# Altium schematic symbol library jlcpcb_2025_04_capacitors_extended_0805.schlib: 3281 symbols (part 10 of 18) (continued)
## CC0805MKX5R5BB106
designator C?  Capacitance: 10uF  (hidden comment: *)
Capacitor, Ceramic (MLCC), 10uF, ±20%, 6.3V, X5R, ±20%, SMD 0805; Manufacturer: YAGEO; Manufacturer Part Number: CC0805MKX5R5BB106; Package Size: 0805; JLCPCB Basic Part: No; JLCPCB Part Number: C527238; Supplier 1: LCSC; Category: Capacitors - MLCC; Supplier Part Number 1: C527238; Tolerance: ±20%; Voltage Rating: 6.3V; Temperature Coefficient: X5R; RoHS: Yes; ComponentLink1Description: Datasheet; ComponentLink1URL: https://wmsc.lcsc.com/wmsc/upload/file/pdf/v2/lcsc/2407081117_YAGEO-CC0805MKX5R5BB106_C527238.pdf; ComponentLink2Description: JLCPCB Part URL; ComponentLink2URL: https://jlcpcb.com/partdetail/C527238; ComponentLink3Description: LCSC Part URL; ComponentLink3URL: https://lcsc.com/product-detail/Multilayer-Ceramic-Capacitors-MLCC---SMD-SMT_YAGEO-YAGEO-CC0805MKX5R5BB106_C527238.html
footprint CAP-0805 (0805 (2012M) Capacitor)
pins: 1, 2

## CC0805MKX5R5BB226
designator C?  Capacitance: 22uF  (hidden comment: *)
Capacitor, Ceramic (MLCC), 22uF, ±20%, 6.3V, X5R, ±20%, SMD 0805; Manufacturer: YAGEO; Manufacturer Part Number: CC0805MKX5R5BB226; Package Size: 0805; JLCPCB Basic Part: No; JLCPCB Part Number: C109462; Supplier 1: LCSC; Category: Capacitors - MLCC; Supplier Part Number 1: C109462; Tolerance: ±20%; Voltage Rating: 6.3V; Temperature Coefficient: X5R; RoHS: Yes; ComponentLink1Description: Datasheet; ComponentLink1URL: https://wmsc.lcsc.com/wmsc/upload/file/pdf/v2/lcsc/2407081117_YAGEO-CC0805MKX5R5BB226_C109462.pdf; ComponentLink2Description: JLCPCB Part URL; ComponentLink2URL: https://jlcpcb.com/partdetail/C109462; ComponentLink3Description: LCSC Part URL; ComponentLink3URL: https://lcsc.com/product-detail/Multilayer-Ceramic-Capacitors-MLCC---SMD-SMT_YAGEO-YAGEO-CC0805MKX5R5BB226_C109462.html
footprint CAP-0805 (0805 (2012M) Capacitor)
pins: 1, 2

## CC0805MKX5R5BB475
designator C?  Capacitance: 4.7uF  (hidden comment: *)
Capacitor, Ceramic (MLCC), 4.7uF, ±20%, 6.3V, X5R, ±20%, SMD 0805; Manufacturer: YAGEO; Manufacturer Part Number: CC0805MKX5R5BB475; Package Size: 0805; JLCPCB Basic Part: No; JLCPCB Part Number: C577033; Supplier 1: LCSC; Category: Capacitors - MLCC; Supplier Part Number 1: C577033; Tolerance: ±20%; Voltage Rating: 6.3V; Temperature Coefficient: X5R; RoHS: Yes; ComponentLink1Description: Datasheet; ComponentLink1URL: https://wmsc.lcsc.com/wmsc/upload/file/pdf/v2/lcsc/2407081117_YAGEO-CC0805MKX5R5BB475_C577033.pdf; ComponentLink2Description: JLCPCB Part URL; ComponentLink2URL: https://jlcpcb.com/partdetail/C577033; ComponentLink3Description: LCSC Part URL; ComponentLink3URL: https://lcsc.com/product-detail/Multilayer-Ceramic-Capacitors-MLCC---SMD-SMT_YAGEO-YAGEO-CC0805MKX5R5BB475_C577033.html
footprint CAP-0805 (0805 (2012M) Capacitor)
pins: 1, 2

## CC0805MKX5R5BB476
designator C?  Capacitance: 47uF  (hidden comment: *)
Capacitor, Ceramic (MLCC), 47uF, ±20%, 6.3V, X5R, ±20%, SMD 0805; Manufacturer: YAGEO; Manufacturer Part Number: CC0805MKX5R5BB476; Package Size: 0805; JLCPCB Basic Part: No; JLCPCB Part Number: C109461; Supplier 1: LCSC; Category: Capacitors - MLCC; Supplier Part Number 1: C109461; Tolerance: ±20%; Voltage Rating: 6.3V; Temperature Coefficient: X5R; RoHS: Yes; ComponentLink1Description: Datasheet; ComponentLink1URL: https://wmsc.lcsc.com/wmsc/upload/file/pdf/v2/lcsc/2407081117_YAGEO-CC0805MKX5R5BB476_C109461.pdf; ComponentLink2Description: JLCPCB Part URL; ComponentLink2URL: https://jlcpcb.com/partdetail/C109461; ComponentLink3Description: LCSC Part URL; ComponentLink3URL: https://lcsc.com/product-detail/Multilayer-Ceramic-Capacitors-MLCC---SMD-SMT_YAGEO-YAGEO-CC0805MKX5R5BB476_C109461.html
footprint CAP-0805 (0805 (2012M) Capacitor)
pins: 1, 2

## CC0805MKX5R6BB225
designator C?  Capacitance: 2200000pF  (hidden comment: *)
Capacitor, Ceramic (MLCC), 2200000pF, ±20%, 10V, X5R, ±20%, SMD 0805; Manufacturer: YAGEO; Manufacturer Part Number: CC0805MKX5R6BB225; Package Size: 0805; JLCPCB Basic Part: No; JLCPCB Part Number: C577035; Supplier 1: LCSC; Category: Capacitors - MLCC; Supplier Part Number 1: C577035; Tolerance: ±20%; Voltage Rating: 10V; Temperature Coefficient: X5R; RoHS: Yes; ComponentLink1Description: Datasheet; ComponentLink1URL: https://wmsc.lcsc.com/wmsc/upload/file/pdf/v2/lcsc/2407081117_YAGEO-CC0805MKX5R6BB225_C577035.pdf; ComponentLink2Description: JLCPCB Part URL; ComponentLink2URL: https://jlcpcb.com/partdetail/C577035; ComponentLink3Description: LCSC Part URL; ComponentLink3URL: https://lcsc.com/product-detail/Multilayer-Ceramic-Capacitors-MLCC---SMD-SMT_YAGEO-YAGEO-CC0805MKX5R6BB225_C577035.html
footprint CAP-0805 (0805 (2012M) Capacitor)
pins: 1, 2

## CC0805MKX5R6BB226
designator C?  Capacitance: 22uF  (hidden comment: *)
Capacitor, Ceramic (MLCC), 22uF, ±20%, 10V, X5R, ±20%, SMD 0805; Manufacturer: YAGEO; Manufacturer Part Number: CC0805MKX5R6BB226; Package Size: 0805; JLCPCB Basic Part: No; JLCPCB Part Number: C109314; Supplier 1: LCSC; Category: Capacitors - MLCC; Supplier Part Number 1: C109314; Tolerance: ±20%; Voltage Rating: 10V; Temperature Coefficient: X5R; RoHS: Yes; ComponentLink1Description: Datasheet; ComponentLink1URL: https://wmsc.lcsc.com/wmsc/upload/file/pdf/v2/lcsc/2407081117_YAGEO-CC0805MKX5R6BB226_C109314.pdf; ComponentLink2Description: JLCPCB Part URL; ComponentLink2URL: https://jlcpcb.com/partdetail/C109314; ComponentLink3Description: LCSC Part URL; ComponentLink3URL: https://lcsc.com/product-detail/Multilayer-Ceramic-Capacitors-MLCC---SMD-SMT_YAGEO-YAGEO-CC0805MKX5R6BB226_C109314.html
footprint CAP-0805 (0805 (2012M) Capacitor)
pins: 1, 2

## CC0805MKX5R6BB476
designator C?  Capacitance: 47uF  (hidden comment: *)
Capacitor, Ceramic (MLCC), 47uF, ±20%, 10V, X5R, ±20%, SMD 0805; Manufacturer: YAGEO; Manufacturer Part Number: CC0805MKX5R6BB476; Package Size: 0805; JLCPCB Basic Part: No; JLCPCB Part Number: C2179580; Supplier 1: LCSC; Category: Capacitors - MLCC; Supplier Part Number 1: C2179580; Tolerance: ±20%; Voltage Rating: 10V; Temperature Coefficient: X5R; RoHS: Yes; ComponentLink1Description: Datasheet; ComponentLink1URL: https://wmsc.lcsc.com/wmsc/upload/file/pdf/v2/lcsc/2407081117_YAGEO-CC0805MKX5R6BB476_C2179580.pdf; ComponentLink2Description: JLCPCB Part URL; ComponentLink2URL: https://jlcpcb.com/partdetail/C2179580; ComponentLink3Description: LCSC Part URL; ComponentLink3URL: https://lcsc.com/product-detail/Multilayer-Ceramic-Capacitors-MLCC---SMD-SMT_YAGEO-YAGEO-CC0805MKX5R6BB476_C2179580.html
footprint CAP-0805 (0805 (2012M) Capacitor)
pins: 1, 2

## CC0805MKX5R7BB226
designator C?  Capacitance: 22uF  (hidden comment: *)
Capacitor, Ceramic (MLCC), 22uF, ±20%, 16V, X5R, ±20%, SMD 0805; Manufacturer: YAGEO; Manufacturer Part Number: CC0805MKX5R7BB226; Package Size: 0805; JLCPCB Basic Part: No; JLCPCB Part Number: C128856; Supplier 1: LCSC; Category: Capacitors - MLCC; Supplier Part Number 1: C128856; Tolerance: ±20%; Voltage Rating: 16V; Temperature Coefficient: X5R; RoHS: Yes; ComponentLink1Description: Datasheet; ComponentLink1URL: https://wmsc.lcsc.com/wmsc/upload/file/pdf/v2/lcsc/2407081117_YAGEO-CC0805MKX5R7BB226_C128856.pdf; ComponentLink2Description: JLCPCB Part URL; ComponentLink2URL: https://jlcpcb.com/partdetail/C128856; ComponentLink3Description: LCSC Part URL; ComponentLink3URL: https://lcsc.com/product-detail/Multilayer-Ceramic-Capacitors-MLCC---SMD-SMT_YAGEO-YAGEO-CC0805MKX5R7BB226_C128856.html
footprint CAP-0805 (0805 (2012M) Capacitor)
pins: 1, 2

## CC0805MKX5R8BB105
designator C?  Capacitance: 1uF  (hidden comment: *)
Capacitor, Ceramic (MLCC), 1uF, ±20%, 25V, X5R, ±20%, SMD 0805; Manufacturer: YAGEO; Manufacturer Part Number: CC0805MKX5R8BB105; Package Size: 0805; JLCPCB Basic Part: No; JLCPCB Part Number: C577038; Supplier 1: LCSC; Category: Capacitors - MLCC; Supplier Part Number 1: C577038; Tolerance: ±20%; Voltage Rating: 25V; Temperature Coefficient: X5R; RoHS: Yes; ComponentLink1Description: Datasheet; ComponentLink1URL: https://wmsc.lcsc.com/wmsc/upload/file/pdf/v2/lcsc/2407081117_YAGEO-CC0805MKX5R8BB105_C577038.pdf; ComponentLink2Description: JLCPCB Part URL; ComponentLink2URL: https://jlcpcb.com/partdetail/C577038; ComponentLink3Description: LCSC Part URL; ComponentLink3URL: https://lcsc.com/product-detail/Multilayer-Ceramic-Capacitors-MLCC---SMD-SMT_YAGEO-YAGEO-CC0805MKX5R8BB105_C577038.html
footprint CAP-0805 (0805 (2012M) Capacitor)
pins: 1, 2

## CC0805MKX5R8BB226
designator C?  Capacitance: 22uF  (hidden comment: *)
Capacitor, Ceramic (MLCC), 22uF, ±20%, 25V, X5R, ±20%, SMD 0805; Manufacturer: YAGEO; Manufacturer Part Number: CC0805MKX5R8BB226; Package Size: 0805; JLCPCB Basic Part: No; JLCPCB Part Number: C784585; Supplier 1: LCSC; Category: Capacitors - MLCC; Supplier Part Number 1: C784585; Tolerance: ±20%; Voltage Rating: 25V; Temperature Coefficient: X5R; RoHS: Yes; ComponentLink1Description: Datasheet; ComponentLink1URL: https://wmsc.lcsc.com/wmsc/upload/file/pdf/v2/lcsc/2407081117_YAGEO-CC0805MKX5R8BB226_C784585.pdf; ComponentLink2Description: JLCPCB Part URL; ComponentLink2URL: https://jlcpcb.com/partdetail/C784585; ComponentLink3Description: LCSC Part URL; ComponentLink3URL: https://lcsc.com/product-detail/Multilayer-Ceramic-Capacitors-MLCC---SMD-SMT_YAGEO-YAGEO-CC0805MKX5R8BB226_C784585.html
footprint CAP-0805 (0805 (2012M) Capacitor)
pins: 1, 2

## CC0805MKX7R6BB105
designator C?  Capacitance: 1uF  (hidden comment: *)
Capacitor, Ceramic (MLCC), 1uF, ±20%, 10V, X7R, ±20%, SMD 0805; Manufacturer: YAGEO; Manufacturer Part Number: CC0805MKX7R6BB105; Package Size: 0805; JLCPCB Basic Part: No; JLCPCB Part Number: C527239; Supplier 1: LCSC; Category: Capacitors - MLCC; Supplier Part Number 1: C527239; Tolerance: ±20%; Voltage Rating: 10V; Temperature Coefficient: X7R; RoHS: Yes; ComponentLink1Description: Datasheet; ComponentLink1URL: https://wmsc.lcsc.com/wmsc/upload/file/pdf/v2/lcsc/2006101835_YAGEO-CC0805MKX7R6BB105_C527239.pdf; ComponentLink2Description: JLCPCB Part URL; ComponentLink2URL: https://jlcpcb.com/partdetail/C527239; ComponentLink3Description: LCSC Part URL; ComponentLink3URL: https://lcsc.com/product-detail/Multilayer-Ceramic-Capacitors-MLCC---SMD-SMT_YAGEO-YAGEO-CC0805MKX7R6BB105_C527239.html
footprint CAP-0805 (0805 (2012M) Capacitor)
pins: 1, 2

## CC0805MKX7R6BB225
designator C?  Capacitance: 2.2uF  (hidden comment: *)
Capacitor, Ceramic (MLCC), 2.2uF, ±20%, 10V, X7R, ±20%, SMD 0805; Manufacturer: YAGEO; Manufacturer Part Number: CC0805MKX7R6BB225; Package Size: 0805; JLCPCB Basic Part: No; JLCPCB Part Number: C527240; Supplier 1: LCSC; Category: Capacitors - MLCC; Supplier Part Number 1: C527240; Tolerance: ±20%; Voltage Rating: 10V; Temperature Coefficient: X7R; RoHS: Yes; ComponentLink1Description: Datasheet; ComponentLink1URL: https://wmsc.lcsc.com/wmsc/upload/file/pdf/v2/lcsc/2005262135_YAGEO-CC0805MKX7R6BB225_C527240.pdf; ComponentLink2Description: JLCPCB Part URL; ComponentLink2URL: https://jlcpcb.com/partdetail/C527240; ComponentLink3Description: LCSC Part URL; ComponentLink3URL: https://lcsc.com/product-detail/Multilayer-Ceramic-Capacitors-MLCC---SMD-SMT_YAGEO-YAGEO-CC0805MKX7R6BB225_C527240.html
footprint CAP-0805 (0805 (2012M) Capacitor)
pins: 1, 2

## CC0805MKX7R7BB105
designator C?  Capacitance: 1uF  (hidden comment: *)
Capacitor, Ceramic (MLCC), 1uF, ±20%, 16V, X7R, ±20%, SMD 0805; Manufacturer: YAGEO; Manufacturer Part Number: CC0805MKX7R7BB105; Package Size: 0805; JLCPCB Basic Part: No; JLCPCB Part Number: C577039; Supplier 1: LCSC; Category: Capacitors - MLCC; Supplier Part Number 1: C577039; Tolerance: ±20%; Voltage Rating: 16V; Temperature Coefficient: X7R; RoHS: Yes; ComponentLink1Description: Datasheet; ComponentLink1URL: https://wmsc.lcsc.com/wmsc/upload/file/pdf/v2/lcsc/2204211700_YAGEO-CC0805MKX7R7BB105_C577039.pdf; ComponentLink2Description: JLCPCB Part URL; ComponentLink2URL: https://jlcpcb.com/partdetail/C577039; ComponentLink3Description: LCSC Part URL; ComponentLink3URL: https://lcsc.com/product-detail/Multilayer-Ceramic-Capacitors-MLCC---SMD-SMT_YAGEO-YAGEO-CC0805MKX7R7BB105_C577039.html
footprint CAP-0805 (0805 (2012M) Capacitor)
pins: 1, 2

## CC0805MKX7R7BB106
designator C?  Capacitance: 10uF  (hidden comment: *)
Capacitor, Ceramic (MLCC), 10uF, ±20%, 16V, X7R, ±20%, SMD 0805; Manufacturer: YAGEO; Manufacturer Part Number: CC0805MKX7R7BB106; Package Size: 0805; JLCPCB Basic Part: No; JLCPCB Part Number: C1952587; Supplier 1: LCSC; Category: Capacitors - MLCC; Supplier Part Number 1: C1952587; Tolerance: ±20%; Voltage Rating: 16V; Temperature Coefficient: X7R; RoHS: Yes; ComponentLink1Description: Datasheet; ComponentLink1URL: https://wmsc.lcsc.com/wmsc/upload/file/pdf/v2/lcsc/2201291000_YAGEO-CC0805MKX7R7BB106_C1952587.pdf; ComponentLink2Description: JLCPCB Part URL; ComponentLink2URL: https://jlcpcb.com/partdetail/C1952587; ComponentLink3Description: LCSC Part URL; ComponentLink3URL: https://lcsc.com/product-detail/Multilayer-Ceramic-Capacitors-MLCC---SMD-SMT_YAGEO-YAGEO-CC0805MKX7R7BB106_C1952587.html
footprint CAP-0805 (0805 (2012M) Capacitor)
pins: 1, 2

## CC0805MKX7RYBB103
designator C?  Capacitance: 10nF  (hidden comment: *)
Capacitor, Ceramic (MLCC), 10nF, ±20%, 250V, X7R, ±20%, SMD 0805; Manufacturer: YAGEO; Manufacturer Part Number: CC0805MKX7RYBB103; Package Size: 0805; JLCPCB Basic Part: No; JLCPCB Part Number: C527241; Supplier 1: LCSC; Category: Capacitors - MLCC; Supplier Part Number 1: C527241; Tolerance: ±20%; Voltage Rating: 250V; Temperature Coefficient: X7R; RoHS: Yes; ComponentLink1Description: Datasheet; ComponentLink1URL: https://wmsc.lcsc.com/wmsc/upload/file/pdf/v2/lcsc/2007301233_YAGEO-CC0805MKX7RYBB103_C527241.pdf; ComponentLink2Description: JLCPCB Part URL; ComponentLink2URL: https://jlcpcb.com/partdetail/C527241; ComponentLink3Description: LCSC Part URL; ComponentLink3URL: https://lcsc.com/product-detail/Multilayer-Ceramic-Capacitors-MLCC---SMD-SMT_YAGEO-YAGEO-CC0805MKX7RYBB103_C527241.html
footprint CAP-0805 (0805 (2012M) Capacitor)
pins: 1, 2

## CC0805MKY5V6BB106
designator C?  Capacitance: 10uF  (hidden comment: *)
Capacitor, Ceramic (MLCC), 10uF, ±20%, 10V, Y5V, ±20%, SMD 0805; Manufacturer: YAGEO; Manufacturer Part Number: CC0805MKY5V6BB106; Package Size: 0805; JLCPCB Basic Part: No; JLCPCB Part Number: C520050; Supplier 1: LCSC; Category: Capacitors - MLCC; Supplier Part Number 1: C520050; Tolerance: ±20%; Voltage Rating: 10V; Temperature Coefficient: Y5V; RoHS: Yes; ComponentLink1Description: Datasheet; ComponentLink1URL: https://wmsc.lcsc.com/wmsc/upload/file/pdf/v2/lcsc/2006011836_YAGEO-CC0805MKY5V6BB106_C520050.pdf; ComponentLink2Description: JLCPCB Part URL; ComponentLink2URL: https://jlcpcb.com/partdetail/C520050; ComponentLink3Description: LCSC Part URL; ComponentLink3URL: https://lcsc.com/product-detail/Multilayer-Ceramic-Capacitors-MLCC---SMD-SMT_YAGEO-YAGEO-CC0805MKY5V6BB106_C520050.html
footprint CAP-0805 (0805 (2012M) Capacitor)
pins: 1, 2

## CC0805MKY5V6BB475
designator C?  Capacitance: 4.7uF  (hidden comment: *)
Capacitor, Ceramic (MLCC), 4.7uF, ±20%, 10V, Y5V, ±20%, SMD 0805; Manufacturer: YAGEO; Manufacturer Part Number: CC0805MKY5V6BB475; Package Size: 0805; JLCPCB Basic Part: No; JLCPCB Part Number: C520081; Supplier 1: LCSC; Category: Capacitors - MLCC; Supplier Part Number 1: C520081; Tolerance: ±20%; Voltage Rating: 10V; Temperature Coefficient: Y5V; RoHS: Yes; ComponentLink1Description: Datasheet; ComponentLink1URL: https://wmsc.lcsc.com/wmsc/upload/file/pdf/v2/lcsc/2007161235_YAGEO-CC0805MKY5V6BB475_C520081.pdf; ComponentLink2Description: JLCPCB Part URL; ComponentLink2URL: https://jlcpcb.com/partdetail/C520081; ComponentLink3Description: LCSC Part URL; ComponentLink3URL: https://lcsc.com/product-detail/Multilayer-Ceramic-Capacitors-MLCC---SMD-SMT_YAGEO-YAGEO-CC0805MKY5V6BB475_C520081.html
footprint CAP-0805 (0805 (2012M) Capacitor)
pins: 1, 2

## CC0805MKY5V9BB105
designator C?  Capacitance: 1uF  (hidden comment: *)
Capacitor, Ceramic (MLCC), 1uF, ±20%, 50V, Y5V, ±20%, SMD 0805; Manufacturer: YAGEO; Manufacturer Part Number: CC0805MKY5V9BB105; Package Size: 0805; JLCPCB Basic Part: No; JLCPCB Part Number: C520052; Supplier 1: LCSC; Category: Capacitors - MLCC; Supplier Part Number 1: C520052; Tolerance: ±20%; Voltage Rating: 50V; Temperature Coefficient: Y5V; RoHS: Yes; ComponentLink1Description: Datasheet; ComponentLink1URL: https://wmsc.lcsc.com/wmsc/upload/file/pdf/v2/lcsc/2009111706_YAGEO-CC0805MKY5V9BB105_C520052.pdf; ComponentLink2Description: JLCPCB Part URL; ComponentLink2URL: https://jlcpcb.com/partdetail/C520052; ComponentLink3Description: LCSC Part URL; ComponentLink3URL: https://lcsc.com/product-detail/Multilayer-Ceramic-Capacitors-MLCC---SMD-SMT_YAGEO-YAGEO-CC0805MKY5V9BB105_C520052.html
footprint CAP-0805 (0805 (2012M) Capacitor)
pins: 1, 2

## CC0805MRX5R5BB226
designator C?  Capacitance: 22uF  (hidden comment: *)
Capacitor, Ceramic (MLCC), 22uF, ±20%, 6.3V, X5R, ±20%, SMD 0805; Manufacturer: YAGEO; Manufacturer Part Number: CC0805MRX5R5BB226; Package Size: 0805; JLCPCB Basic Part: No; JLCPCB Part Number: C1952585; Supplier 1: LCSC; Category: Capacitors - MLCC; Supplier Part Number 1: C1952585; Tolerance: ±20%; Voltage Rating: 6.3V; Temperature Coefficient: X5R; RoHS: Yes; ComponentLink1Description: Datasheet; ComponentLink1URL: https://wmsc.lcsc.com/wmsc/upload/file/pdf/v2/lcsc/2407081117_YAGEO-CC0805MRX5R5BB226_C1952585.pdf; ComponentLink2Description: JLCPCB Part URL; ComponentLink2URL: https://jlcpcb.com/partdetail/C1952585; ComponentLink3Description: LCSC Part URL; ComponentLink3URL: https://lcsc.com/product-detail/Multilayer-Ceramic-Capacitors-MLCC---SMD-SMT_YAGEO-YAGEO-CC0805MRX5R5BB226_C1952585.html
footprint CAP-0805 (0805 (2012M) Capacitor)
pins: 1, 2

## CC0805MRX7R7BB104
designator C?  Capacitance: 100nF  (hidden comment: *)
Capacitor, Ceramic (MLCC), 100nF, ±20%, 16V, X7R, ±20%, SMD 0805; Manufacturer: YAGEO; Manufacturer Part Number: CC0805MRX7R7BB104; Package Size: 0805; JLCPCB Basic Part: No; JLCPCB Part Number: C1853649; Supplier 1: LCSC; Category: Capacitors - MLCC; Supplier Part Number 1: C1853649; Tolerance: ±20%; Voltage Rating: 16V; Temperature Coefficient: X7R; RoHS: Yes; ComponentLink1Description: Datasheet; ComponentLink1URL: https://wmsc.lcsc.com/wmsc/upload/file/pdf/v2/lcsc/2201271100_YAGEO-CC0805MRX7R7BB104_C1853649.pdf; ComponentLink2Description: JLCPCB Part URL; ComponentLink2URL: https://jlcpcb.com/partdetail/C1853649; ComponentLink3Description: LCSC Part URL; ComponentLink3URL: https://lcsc.com/product-detail/Multilayer-Ceramic-Capacitors-MLCC---SMD-SMT_YAGEO-YAGEO-CC0805MRX7R7BB104_C1853649.html
footprint CAP-0805 (0805 (2012M) Capacitor)
pins: 1, 2

## CC0805MRX7R8BB103
designator C?  Capacitance: 10nF  (hidden comment: *)
Capacitor, Ceramic (MLCC), 10nF, ±20%, 25V, X7R, ±20%, SMD 0805; Manufacturer: YAGEO; Manufacturer Part Number: CC0805MRX7R8BB103; Package Size: 0805; JLCPCB Basic Part: No; JLCPCB Part Number: C2180714; Supplier 1: LCSC; Category: Capacitors - MLCC; Supplier Part Number 1: C2180714; Tolerance: ±20%; Voltage Rating: 25V; Temperature Coefficient: X7R; RoHS: Yes; ComponentLink1Description: Datasheet; ComponentLink1URL: https://wmsc.lcsc.com/wmsc/upload/file/pdf/v2/lcsc/2202041130_YAGEO-CC0805MRX7R8BB103_C2180714.pdf; ComponentLink2Description: JLCPCB Part URL; ComponentLink2URL: https://jlcpcb.com/partdetail/C2180714; ComponentLink3Description: LCSC Part URL; ComponentLink3URL: https://lcsc.com/product-detail/Multilayer-Ceramic-Capacitors-MLCC---SMD-SMT_YAGEO-YAGEO-CC0805MRX7R8BB103_C2180714.html
footprint CAP-0805 (0805 (2012M) Capacitor)
pins: 1, 2

## CC0805MRX7R8BB104
designator C?  Capacitance: 100nF  (hidden comment: *)
Capacitor, Ceramic (MLCC), 100nF, ±20%, 25V, X7R, ±20%, SMD 0805; Manufacturer: YAGEO; Manufacturer Part Number: CC0805MRX7R8BB104; Package Size: 0805; JLCPCB Basic Part: No; JLCPCB Part Number: C2180294; Supplier 1: LCSC; Category: Capacitors - MLCC; Supplier Part Number 1: C2180294; Tolerance: ±20%; Voltage Rating: 25V; Temperature Coefficient: X7R; RoHS: Yes; ComponentLink1Description: Datasheet; ComponentLink1URL: https://wmsc.lcsc.com/wmsc/upload/file/pdf/v2/lcsc/2202041130_YAGEO-CC0805MRX7R8BB104_C2180294.pdf; ComponentLink2Description: JLCPCB Part URL; ComponentLink2URL: https://jlcpcb.com/partdetail/C2180294; ComponentLink3Description: LCSC Part URL; ComponentLink3URL: https://lcsc.com/product-detail/Multilayer-Ceramic-Capacitors-MLCC---SMD-SMT_YAGEO-YAGEO-CC0805MRX7R8BB104_C2180294.html
footprint CAP-0805 (0805 (2012M) Capacitor)
pins: 1, 2

## CC0805MRX7R9BB102
designator C?  Capacitance: 1nF  (hidden comment: *)
Capacitor, Ceramic (MLCC), 1nF, ±20%, 50V, X7R, ±20%, SMD 0805; Manufacturer: YAGEO; Manufacturer Part Number: CC0805MRX7R9BB102; Package Size: 0805; JLCPCB Basic Part: No; JLCPCB Part Number: C2180859; Supplier 1: LCSC; Category: Capacitors - MLCC; Supplier Part Number 1: C2180859; Tolerance: ±20%; Voltage Rating: 50V; Temperature Coefficient: X7R; RoHS: Yes; ComponentLink1Description: Datasheet; ComponentLink1URL: https://wmsc.lcsc.com/wmsc/upload/file/pdf/v2/lcsc/2202041130_YAGEO-CC0805MRX7R9BB102_C2180859.pdf; ComponentLink2Description: JLCPCB Part URL; ComponentLink2URL: https://jlcpcb.com/partdetail/C2180859; ComponentLink3Description: LCSC Part URL; ComponentLink3URL: https://lcsc.com/product-detail/Multilayer-Ceramic-Capacitors-MLCC---SMD-SMT_YAGEO-YAGEO-CC0805MRX7R9BB102_C2180859.html
footprint CAP-0805 (0805 (2012M) Capacitor)
pins: 1, 2

## CC0805MRX7R9BB103
designator C?  Capacitance: 10nF  (hidden comment: *)
Capacitor, Ceramic (MLCC), 10nF, ±20%, 50V, X7R, ±20%, SMD 0805; Manufacturer: YAGEO; Manufacturer Part Number: CC0805MRX7R9BB103; Package Size: 0805; JLCPCB Basic Part: No; JLCPCB Part Number: C2169410; Supplier 1: LCSC; Category: Capacitors - MLCC; Supplier Part Number 1: C2169410; Tolerance: ±20%; Voltage Rating: 50V; Temperature Coefficient: X7R; RoHS: Yes; ComponentLink1Description: Datasheet; ComponentLink1URL: https://wmsc.lcsc.com/wmsc/upload/file/pdf/v2/lcsc/2202040330_YAGEO-CC0805MRX7R9BB103_C2169410.pdf; ComponentLink2Description: JLCPCB Part URL; ComponentLink2URL: https://jlcpcb.com/partdetail/C2169410; ComponentLink3Description: LCSC Part URL; ComponentLink3URL: https://lcsc.com/product-detail/Multilayer-Ceramic-Capacitors-MLCC---SMD-SMT_YAGEO-YAGEO-CC0805MRX7R9BB103_C2169410.html
footprint CAP-0805 (0805 (2012M) Capacitor)
pins: 1, 2

## CC0805MRX7R9BB471
designator C?  Capacitance: 470pF  (hidden comment: *)
Capacitor, Ceramic (MLCC), 470pF, ±20%, 50V, X7R, ±20%, SMD 0805; Manufacturer: YAGEO; Manufacturer Part Number: CC0805MRX7R9BB471; Package Size: 0805; JLCPCB Basic Part: No; JLCPCB Part Number: C1853344; Supplier 1: LCSC; Category: Capacitors - MLCC; Supplier Part Number 1: C1853344; Tolerance: ±20%; Voltage Rating: 50V; Temperature Coefficient: X7R; RoHS: Yes; ComponentLink1Description: Datasheet; ComponentLink1URL: https://wmsc.lcsc.com/wmsc/upload/file/pdf/v2/lcsc/2201271030_YAGEO-CC0805MRX7R9BB471_C1853344.pdf; ComponentLink2Description: JLCPCB Part URL; ComponentLink2URL: https://jlcpcb.com/partdetail/C1853344; ComponentLink3Description: LCSC Part URL; ComponentLink3URL: https://lcsc.com/product-detail/Multilayer-Ceramic-Capacitors-MLCC---SMD-SMT_YAGEO-YAGEO-CC0805MRX7R9BB471_C1853344.html
footprint CAP-0805 (0805 (2012M) Capacitor)
pins: 1, 2

## CC0805MRX7R9BB473
designator C?  Capacitance: 47nF  (hidden comment: *)
Capacitor, Ceramic (MLCC), 47nF, ±20%, 50V, X7R, ±20%, SMD 0805; Manufacturer: YAGEO; Manufacturer Part Number: CC0805MRX7R9BB473; Package Size: 0805; JLCPCB Basic Part: No; JLCPCB Part Number: C2177092; Supplier 1: LCSC; Category: Capacitors - MLCC; Supplier Part Number 1: C2177092; Tolerance: ±20%; Voltage Rating: 50V; Temperature Coefficient: X7R; RoHS: Yes; ComponentLink1Description: Datasheet; ComponentLink1URL: https://wmsc.lcsc.com/wmsc/upload/file/pdf/v2/lcsc/2202040900_YAGEO-CC0805MRX7R9BB473_C2177092.pdf; ComponentLink2Description: JLCPCB Part URL; ComponentLink2URL: https://jlcpcb.com/partdetail/C2177092; ComponentLink3Description: LCSC Part URL; ComponentLink3URL: https://lcsc.com/product-detail/Multilayer-Ceramic-Capacitors-MLCC---SMD-SMT_YAGEO-YAGEO-CC0805MRX7R9BB473_C2177092.html
footprint CAP-0805 (0805 (2012M) Capacitor)
pins: 1, 2

## CC0805MRY5V7BB105
designator C?  Capacitance: 1uF  (hidden comment: *)
Capacitor, Ceramic (MLCC), 1uF, ±20%, 16V, Y5V, ±20%, SMD 0805; Manufacturer: YAGEO; Manufacturer Part Number: CC0805MRY5V7BB105; Package Size: 0805; JLCPCB Basic Part: No; JLCPCB Part Number: C520017; Supplier 1: LCSC; Category: Capacitors - MLCC; Supplier Part Number 1: C520017; Tolerance: ±20%; Voltage Rating: 16V; Temperature Coefficient: Y5V; RoHS: Yes; ComponentLink1Description: Datasheet; ComponentLink1URL: https://wmsc.lcsc.com/wmsc/upload/file/pdf/v2/lcsc/2008191833_YAGEO-CC0805MRY5V7BB105_C520017.pdf; ComponentLink2Description: JLCPCB Part URL; ComponentLink2URL: https://jlcpcb.com/partdetail/C520017; ComponentLink3Description: LCSC Part URL; ComponentLink3URL: https://lcsc.com/product-detail/Multilayer-Ceramic-Capacitors-MLCC---SMD-SMT_YAGEO-YAGEO-CC0805MRY5V7BB105_C520017.html
footprint CAP-0805 (0805 (2012M) Capacitor)
pins: 1, 2

## CC0805MRY5V7BB225
designator C?  Capacitance: 2.2uF  (hidden comment: *)
Capacitor, Ceramic (MLCC), 2.2uF, ±20%, 16V, Y5V, ±20%, SMD 0805; Manufacturer: YAGEO; Manufacturer Part Number: CC0805MRY5V7BB225; Package Size: 0805; JLCPCB Basic Part: No; JLCPCB Part Number: C527243; Supplier 1: LCSC; Category: Capacitors - MLCC; Supplier Part Number 1: C527243; Tolerance: ±20%; Voltage Rating: 16V; Temperature Coefficient: Y5V; RoHS: Yes; ComponentLink1Description: Datasheet; ComponentLink1URL: https://wmsc.lcsc.com/wmsc/upload/file/pdf/v2/lcsc/2006241834_YAGEO-CC0805MRY5V7BB225_C527243.pdf; ComponentLink2Description: JLCPCB Part URL; ComponentLink2URL: https://jlcpcb.com/partdetail/C527243; ComponentLink3Description: LCSC Part URL; ComponentLink3URL: https://lcsc.com/product-detail/Multilayer-Ceramic-Capacitors-MLCC---SMD-SMT_YAGEO-YAGEO-CC0805MRY5V7BB225_C527243.html
footprint CAP-0805 (0805 (2012M) Capacitor)
pins: 1, 2

## CC0805MRY5V8BB105
designator C?  Capacitance: 1uF  (hidden comment: *)
Capacitor, Ceramic (MLCC), 1uF, ±20%, 25V, Y5V, ±20%, SMD 0805; Manufacturer: YAGEO; Manufacturer Part Number: CC0805MRY5V8BB105; Package Size: 0805; JLCPCB Basic Part: No; JLCPCB Part Number: C520018; Supplier 1: LCSC; Category: Capacitors - MLCC; Supplier Part Number 1: C520018; Tolerance: ±20%; Voltage Rating: 25V; Temperature Coefficient: Y5V; RoHS: Yes; ComponentLink1Description: Datasheet; ComponentLink1URL: https://wmsc.lcsc.com/wmsc/upload/file/pdf/v2/lcsc/2008191833_YAGEO-CC0805MRY5V8BB105_C520018.pdf; ComponentLink2Description: JLCPCB Part URL; ComponentLink2URL: https://jlcpcb.com/partdetail/C520018; ComponentLink3Description: LCSC Part URL; ComponentLink3URL: https://lcsc.com/product-detail/Multilayer-Ceramic-Capacitors-MLCC---SMD-SMT_YAGEO-YAGEO-CC0805MRY5V8BB105_C520018.html
footprint CAP-0805 (0805 (2012M) Capacitor)
pins: 1, 2

## CC0805ZKY5V5BB106
designator C?  Capacitance: 10uF  (hidden comment: *)
Capacitor, Ceramic (MLCC), 10uF, 6.3V, Y5V, SMD 0805; Manufacturer: YAGEO; Manufacturer Part Number: CC0805ZKY5V5BB106; Temperature Rating: -20%~+80%; Package Size: 0805; JLCPCB Basic Part: No; JLCPCB Part Number: C2169262; Supplier 1: LCSC; Category: Capacitors - MLCC; Supplier Part Number 1: C2169262; Voltage Rating: 6.3V; Temperature Coefficient: Y5V; RoHS: Yes; ComponentLink1Description: Datasheet; ComponentLink1URL: https://wmsc.lcsc.com/wmsc/upload/file/pdf/v2/lcsc/2202040330_YAGEO-CC0805ZKY5V5BB106_C2169262.pdf; ComponentLink2Description: JLCPCB Part URL; ComponentLink2URL: https://jlcpcb.com/partdetail/C2169262; ComponentLink3Description: LCSC Part URL; ComponentLink3URL: https://lcsc.com/product-detail/Multilayer-Ceramic-Capacitors-MLCC---SMD-SMT_YAGEO-YAGEO-CC0805ZKY5V5BB106_C2169262.html
footprint CAP-0805 (0805 (2012M) Capacitor)
pins: 1, 2

## CC0805ZKY5V5BB226
designator C?  Capacitance: 22uF  (hidden comment: *)
Capacitor, Ceramic (MLCC), 22uF, 6.3V, Y5V, SMD 0805; Manufacturer: YAGEO; Manufacturer Part Number: CC0805ZKY5V5BB226; Temperature Rating: -20%~+80%; Package Size: 0805; JLCPCB Basic Part: No; JLCPCB Part Number: C577040; Supplier 1: LCSC; Category: Capacitors - MLCC; Supplier Part Number 1: C577040; Voltage Rating: 6.3V; Temperature Coefficient: Y5V; RoHS: Yes; ComponentLink1Description: Datasheet; ComponentLink1URL: https://wmsc.lcsc.com/wmsc/upload/file/pdf/v2/lcsc/2203102158_YAGEO-CC0805ZKY5V5BB226_C577040.pdf; ComponentLink2Description: JLCPCB Part URL; ComponentLink2URL: https://jlcpcb.com/partdetail/C577040; ComponentLink3Description: LCSC Part URL; ComponentLink3URL: https://lcsc.com/product-detail/Multilayer-Ceramic-Capacitors-MLCC---SMD-SMT_YAGEO-YAGEO-CC0805ZKY5V5BB226_C577040.html
footprint CAP-0805 (0805 (2012M) Capacitor)
pins: 1, 2

## CC0805ZKY5V6BB106
designator C?  Capacitance: 10uF  (hidden comment: *)
Capacitor, Ceramic (MLCC), 10uF, 10V, Y5V, SMD 0805; Manufacturer: YAGEO; Manufacturer Part Number: CC0805ZKY5V6BB106; Temperature Rating: -20%~+80%; Package Size: 0805; JLCPCB Basic Part: No; JLCPCB Part Number: C88484; Supplier 1: LCSC; Category: Capacitors - MLCC; Supplier Part Number 1: C88484; Voltage Rating: 10V; Temperature Coefficient: Y5V; RoHS: Yes; ComponentLink1Description: Datasheet; ComponentLink1URL: https://wmsc.lcsc.com/wmsc/upload/file/pdf/v2/lcsc/1810311438_YAGEO-CC0805ZKY5V6BB106_C88484.pdf; ComponentLink2Description: JLCPCB Part URL; ComponentLink2URL: https://jlcpcb.com/partdetail/C88484; ComponentLink3Description: LCSC Part URL; ComponentLink3URL: https://lcsc.com/product-detail/Multilayer-Ceramic-Capacitors-MLCC---SMD-SMT_YAGEO-YAGEO-CC0805ZKY5V6BB106_C88484.html
footprint CAP-0805 (0805 (2012M) Capacitor)
pins: 1, 2

## CC0805ZKY5V6BB335
designator C?  Capacitance: 3.3uF  (hidden comment: *)
Capacitor, Ceramic (MLCC), 3.3uF, 10V, Y5V, SMD 0805; Manufacturer: YAGEO; Manufacturer Part Number: CC0805ZKY5V6BB335; Temperature Rating: -20%~+80%; Package Size: 0805; JLCPCB Basic Part: No; JLCPCB Part Number: C577041; Supplier 1: LCSC; Category: Capacitors - MLCC; Supplier Part Number 1: C577041; Voltage Rating: 10V; Temperature Coefficient: Y5V; RoHS: Yes; ComponentLink1Description: Datasheet; ComponentLink1URL: https://wmsc.lcsc.com/wmsc/upload/file/pdf/v2/lcsc/2209061800_YAGEO-CC0805ZKY5V6BB335_C577041.pdf; ComponentLink2Description: JLCPCB Part URL; ComponentLink2URL: https://jlcpcb.com/partdetail/C577041; ComponentLink3Description: LCSC Part URL; ComponentLink3URL: https://lcsc.com/product-detail/Multilayer-Ceramic-Capacitors-MLCC---SMD-SMT_YAGEO-YAGEO-CC0805ZKY5V6BB335_C577041.html
footprint CAP-0805 (0805 (2012M) Capacitor)
pins: 1, 2

## CC0805ZKY5V6BB475
designator C?  Capacitance: 4.7uF  (hidden comment: *)
Capacitor, Ceramic (MLCC), 4.7uF, 10V, Y5V, SMD 0805; Manufacturer: YAGEO; Manufacturer Part Number: CC0805ZKY5V6BB475; Temperature Rating: -20%~+80%; Package Size: 0805; JLCPCB Basic Part: No; JLCPCB Part Number: C107170; Supplier 1: LCSC; Category: Capacitors - MLCC; Supplier Part Number 1: C107170; Voltage Rating: 10V; Temperature Coefficient: Y5V; RoHS: Yes; ComponentLink1Description: Datasheet; ComponentLink1URL: https://wmsc.lcsc.com/wmsc/upload/file/pdf/v2/lcsc/2304140030_YAGEO-CC0805ZKY5V6BB475_C107170.pdf; ComponentLink2Description: JLCPCB Part URL; ComponentLink2URL: https://jlcpcb.com/partdetail/C107170; ComponentLink3Description: LCSC Part URL; ComponentLink3URL: https://lcsc.com/product-detail/Multilayer-Ceramic-Capacitors-MLCC---SMD-SMT_YAGEO-YAGEO-CC0805ZKY5V6BB475_C107170.html
footprint CAP-0805 (0805 (2012M) Capacitor)
pins: 1, 2

## CC0805ZKY5V7BB106
designator C?  Capacitance: 10uF  (hidden comment: *)
Capacitor, Ceramic (MLCC), 10uF, 16V, Y5V, SMD 0805; Manufacturer: YAGEO; Manufacturer Part Number: CC0805ZKY5V7BB106; Temperature Rating: -20%~+80%; Package Size: 0805; JLCPCB Basic Part: No; JLCPCB Part Number: C106836; Supplier 1: LCSC; Category: Capacitors - MLCC; Supplier Part Number 1: C106836; Voltage Rating: 16V; Temperature Coefficient: Y5V; RoHS: Yes; ComponentLink1Description: Datasheet; ComponentLink1URL: https://wmsc.lcsc.com/wmsc/upload/file/pdf/v2/lcsc/2304140030_YAGEO-CC0805ZKY5V7BB106_C106836.pdf; ComponentLink2Description: JLCPCB Part URL; ComponentLink2URL: https://jlcpcb.com/partdetail/C106836; ComponentLink3Description: LCSC Part URL; ComponentLink3URL: https://lcsc.com/product-detail/Multilayer-Ceramic-Capacitors-MLCC---SMD-SMT_YAGEO-YAGEO-CC0805ZKY5V7BB106_C106836.html
footprint CAP-0805 (0805 (2012M) Capacitor)
pins: 1, 2

## CC0805ZKY5V7BB475
designator C?  Capacitance: 4.7uF  (hidden comment: *)
Capacitor, Ceramic (MLCC), 4.7uF, 16V, Y5V, SMD 0805; Manufacturer: YAGEO; Manufacturer Part Number: CC0805ZKY5V7BB475; Temperature Rating: -20%~+80%; Package Size: 0805; JLCPCB Basic Part: No; JLCPCB Part Number: C106839; Supplier 1: LCSC; Category: Capacitors - MLCC; Supplier Part Number 1: C106839; Voltage Rating: 16V; Temperature Coefficient: Y5V; RoHS: Yes; ComponentLink1Description: Datasheet; ComponentLink1URL: https://wmsc.lcsc.com/wmsc/upload/file/pdf/v2/lcsc/2304140030_YAGEO-CC0805ZKY5V7BB475_C106839.pdf; ComponentLink2Description: JLCPCB Part URL; ComponentLink2URL: https://jlcpcb.com/partdetail/C106839; ComponentLink3Description: LCSC Part URL; ComponentLink3URL: https://lcsc.com/product-detail/Multilayer-Ceramic-Capacitors-MLCC---SMD-SMT_YAGEO-YAGEO-CC0805ZKY5V7BB475_C106839.html
footprint CAP-0805 (0805 (2012M) Capacitor)
pins: 1, 2

## CC0805ZKY5V8BB225
designator C?  Capacitance: 2.2uF  (hidden comment: *)
Capacitor, Ceramic (MLCC), 2.2uF, 25V, Y5V, SMD 0805; Manufacturer: YAGEO; Manufacturer Part Number: CC0805ZKY5V8BB225; Temperature Rating: -20%~+80%; Package Size: 0805; JLCPCB Basic Part: No; JLCPCB Part Number: C94573; Supplier 1: LCSC; Category: Capacitors - MLCC; Supplier Part Number 1: C94573; Voltage Rating: 25V; Temperature Coefficient: Y5V; RoHS: Yes; ComponentLink1Description: Datasheet; ComponentLink1URL: https://wmsc.lcsc.com/wmsc/upload/file/pdf/v2/lcsc/2304140030_YAGEO-CC0805ZKY5V8BB225_C94573.pdf; ComponentLink2Description: JLCPCB Part URL; ComponentLink2URL: https://jlcpcb.com/partdetail/C94573; ComponentLink3Description: LCSC Part URL; ComponentLink3URL: https://lcsc.com/product-detail/Multilayer-Ceramic-Capacitors-MLCC---SMD-SMT_YAGEO-YAGEO-CC0805ZKY5V8BB225_C94573.html
footprint CAP-0805 (0805 (2012M) Capacitor)
pins: 1, 2

## CC0805ZKY5V9BB105
designator C?  Capacitance: 1uF  (hidden comment: *)
Capacitor, Ceramic (MLCC), 1uF, 50V, Y5V, SMD 0805; Manufacturer: YAGEO; Manufacturer Part Number: CC0805ZKY5V9BB105; Temperature Rating: -20%~+80%; Package Size: 0805; JLCPCB Basic Part: No; JLCPCB Part Number: C106838; Supplier 1: LCSC; Category: Capacitors - MLCC; Supplier Part Number 1: C106838; Voltage Rating: 50V; Temperature Coefficient: Y5V; RoHS: Yes; ComponentLink1Description: Datasheet; ComponentLink1URL: https://wmsc.lcsc.com/wmsc/upload/file/pdf/v2/lcsc/2304140030_YAGEO-CC0805ZKY5V9BB105_C106838.pdf; ComponentLink2Description: JLCPCB Part URL; ComponentLink2URL: https://jlcpcb.com/partdetail/C106838; ComponentLink3Description: LCSC Part URL; ComponentLink3URL: https://lcsc.com/product-detail/Multilayer-Ceramic-Capacitors-MLCC---SMD-SMT_YAGEO-YAGEO-CC0805ZKY5V9BB105_C106838.html
footprint CAP-0805 (0805 (2012M) Capacitor)
pins: 1, 2

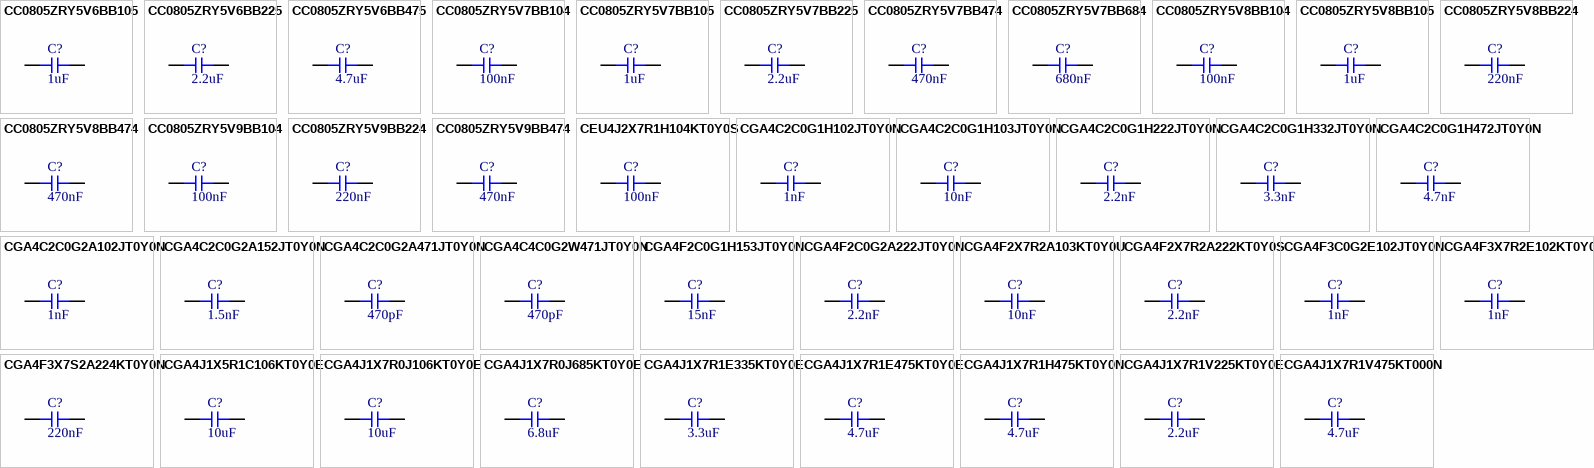
[diagram p46: symbols CC0805ZRY5V6BB105 to CGA4J1X7R1V475KT000N]

## CC0805ZRY5V6BB105
designator C?  Capacitance: 1uF  (hidden comment: *)
Capacitor, Ceramic (MLCC), 1uF, 10V, Y5V, SMD 0805; Manufacturer: YAGEO; Manufacturer Part Number: CC0805ZRY5V6BB105; Temperature Rating: -20%~+80%; Package Size: 0805; JLCPCB Basic Part: No; JLCPCB Part Number: C519974; Supplier 1: LCSC; Category: Capacitors - MLCC; Supplier Part Number 1: C519974; Voltage Rating: 10V; Temperature Coefficient: Y5V; RoHS: Yes; ComponentLink1Description: Datasheet; ComponentLink1URL: https://wmsc.lcsc.com/wmsc/upload/file/pdf/v2/lcsc/2006011835_YAGEO-CC0805ZRY5V6BB105_C519974.pdf; ComponentLink2Description: JLCPCB Part URL; ComponentLink2URL: https://jlcpcb.com/partdetail/C519974; ComponentLink3Description: LCSC Part URL; ComponentLink3URL: https://lcsc.com/product-detail/Multilayer-Ceramic-Capacitors-MLCC---SMD-SMT_YAGEO-YAGEO-CC0805ZRY5V6BB105_C519974.html
footprint CAP-0805 (0805 (2012M) Capacitor)
pins: 1, 2

## CC0805ZRY5V6BB225
designator C?  Capacitance: 2.2uF  (hidden comment: *)
Capacitor, Ceramic (MLCC), 2.2uF, 10V, Y5V, SMD 0805; Manufacturer: YAGEO; Manufacturer Part Number: CC0805ZRY5V6BB225; Temperature Rating: -20%~+80%; Package Size: 0805; JLCPCB Basic Part: No; JLCPCB Part Number: C520072; Supplier 1: LCSC; Category: Capacitors - MLCC; Supplier Part Number 1: C520072; Voltage Rating: 10V; Temperature Coefficient: Y5V; RoHS: Yes; ComponentLink1Description: Datasheet; ComponentLink1URL: https://wmsc.lcsc.com/wmsc/upload/file/pdf/v2/lcsc/2008051835_YAGEO-CC0805ZRY5V6BB225_C520072.pdf; ComponentLink2Description: JLCPCB Part URL; ComponentLink2URL: https://jlcpcb.com/partdetail/C520072; ComponentLink3Description: LCSC Part URL; ComponentLink3URL: https://lcsc.com/product-detail/Multilayer-Ceramic-Capacitors-MLCC---SMD-SMT_YAGEO-YAGEO-CC0805ZRY5V6BB225_C520072.html
footprint CAP-0805 (0805 (2012M) Capacitor)
pins: 1, 2

## CC0805ZRY5V6BB475
designator C?  Capacitance: 4.7uF  (hidden comment: *)
Capacitor, Ceramic (MLCC), 4.7uF, 10V, Y5V, SMD 0805; Manufacturer: YAGEO; Manufacturer Part Number: CC0805ZRY5V6BB475; Temperature Rating: -20%~+80%; Package Size: 0805; JLCPCB Basic Part: No; JLCPCB Part Number: C326951; Supplier 1: LCSC; Category: Capacitors - MLCC; Supplier Part Number 1: C326951; Voltage Rating: 10V; Temperature Coefficient: Y5V; RoHS: Yes; ComponentLink1Description: Datasheet; ComponentLink1URL: https://wmsc.lcsc.com/wmsc/upload/file/pdf/v2/lcsc/2311211121_YAGEO-CC0805ZRY5V6BB475_C326951.pdf; ComponentLink2Description: JLCPCB Part URL; ComponentLink2URL: https://jlcpcb.com/partdetail/C326951; ComponentLink3Description: LCSC Part URL; ComponentLink3URL: https://lcsc.com/product-detail/Multilayer-Ceramic-Capacitors-MLCC---SMD-SMT_YAGEO-YAGEO-CC0805ZRY5V6BB475_C326951.html
footprint CAP-0805 (0805 (2012M) Capacitor)
pins: 1, 2

## CC0805ZRY5V7BB104
designator C?  Capacitance: 100nF  (hidden comment: *)
Capacitor, Ceramic (MLCC), 100nF, 16V, Y5V, SMD 0805; Manufacturer: YAGEO; Manufacturer Part Number: CC0805ZRY5V7BB104; Temperature Rating: -20%~+80%; Package Size: 0805; JLCPCB Basic Part: No; JLCPCB Part Number: C519929; Supplier 1: LCSC; Category: Capacitors - MLCC; Supplier Part Number 1: C519929; Voltage Rating: 16V; Temperature Coefficient: Y5V; RoHS: Yes; ComponentLink1Description: Datasheet; ComponentLink1URL: https://wmsc.lcsc.com/wmsc/upload/file/pdf/v2/lcsc/2204202015_YAGEO-CC0805ZRY5V7BB104_C519929.pdf; ComponentLink2Description: JLCPCB Part URL; ComponentLink2URL: https://jlcpcb.com/partdetail/C519929; ComponentLink3Description: LCSC Part URL; ComponentLink3URL: https://lcsc.com/product-detail/Multilayer-Ceramic-Capacitors-MLCC---SMD-SMT_YAGEO-YAGEO-CC0805ZRY5V7BB104_C519929.html
footprint CAP-0805 (0805 (2012M) Capacitor)
pins: 1, 2

## CC0805ZRY5V7BB105
designator C?  Capacitance: 1uF  (hidden comment: *)
Capacitor, Ceramic (MLCC), 1uF, 16V, Y5V, SMD 0805; Manufacturer: YAGEO; Manufacturer Part Number: CC0805ZRY5V7BB105; Temperature Rating: -20%~+80%; Package Size: 0805; JLCPCB Basic Part: No; JLCPCB Part Number: C513715; Supplier 1: LCSC; Category: Capacitors - MLCC; Supplier Part Number 1: C513715; Voltage Rating: 16V; Temperature Coefficient: Y5V; RoHS: Yes; ComponentLink1Description: Datasheet; ComponentLink1URL: https://wmsc.lcsc.com/wmsc/upload/file/pdf/v2/lcsc/2304140030_YAGEO-CC0805ZRY5V7BB105_C513715.pdf; ComponentLink2Description: JLCPCB Part URL; ComponentLink2URL: https://jlcpcb.com/partdetail/C513715; ComponentLink3Description: LCSC Part URL; ComponentLink3URL: https://lcsc.com/product-detail/Multilayer-Ceramic-Capacitors-MLCC---SMD-SMT_YAGEO-YAGEO-CC0805ZRY5V7BB105_C513715.html
footprint CAP-0805 (0805 (2012M) Capacitor)
pins: 1, 2

## CC0805ZRY5V7BB225
designator C?  Capacitance: 2.2uF  (hidden comment: *)
Capacitor, Ceramic (MLCC), 2.2uF, 16V, Y5V, SMD 0805; Manufacturer: YAGEO; Manufacturer Part Number: CC0805ZRY5V7BB225; Temperature Rating: -20%~+80%; Package Size: 0805; JLCPCB Basic Part: No; JLCPCB Part Number: C107171; Supplier 1: LCSC; Category: Capacitors - MLCC; Supplier Part Number 1: C107171; Voltage Rating: 16V; Temperature Coefficient: Y5V; RoHS: Yes; ComponentLink1Description: Datasheet; ComponentLink1URL: https://wmsc.lcsc.com/wmsc/upload/file/pdf/v2/lcsc/2304140030_YAGEO-CC0805ZRY5V7BB225_C107171.pdf; ComponentLink2Description: JLCPCB Part URL; ComponentLink2URL: https://jlcpcb.com/partdetail/C107171; ComponentLink3Description: LCSC Part URL; ComponentLink3URL: https://lcsc.com/product-detail/Multilayer-Ceramic-Capacitors-MLCC---SMD-SMT_YAGEO-YAGEO-CC0805ZRY5V7BB225_C107171.html
footprint CAP-0805 (0805 (2012M) Capacitor)
pins: 1, 2

## CC0805ZRY5V7BB474
designator C?  Capacitance: 470nF  (hidden comment: *)
Capacitor, Ceramic (MLCC), 470nF, 16V, Y5V, SMD 0805; Manufacturer: YAGEO; Manufacturer Part Number: CC0805ZRY5V7BB474; Temperature Rating: -20%~+80%; Package Size: 0805; JLCPCB Basic Part: No; JLCPCB Part Number: C700525; Supplier 1: LCSC; Category: Capacitors - MLCC; Supplier Part Number 1: C700525; Voltage Rating: 16V; Temperature Coefficient: Y5V; RoHS: Yes; ComponentLink1Description: Datasheet; ComponentLink1URL: https://wmsc.lcsc.com/wmsc/upload/file/pdf/v2/lcsc/2311211121_YAGEO-CC0805ZRY5V7BB474_C700525.pdf; ComponentLink2Description: JLCPCB Part URL; ComponentLink2URL: https://jlcpcb.com/partdetail/C700525; ComponentLink3Description: LCSC Part URL; ComponentLink3URL: https://lcsc.com/product-detail/Multilayer-Ceramic-Capacitors-MLCC---SMD-SMT_YAGEO-YAGEO-CC0805ZRY5V7BB474_C700525.html
footprint CAP-0805 (0805 (2012M) Capacitor)
pins: 1, 2

## CC0805ZRY5V7BB684
designator C?  Capacitance: 680nF  (hidden comment: *)
Capacitor, Ceramic (MLCC), 680nF, 16V, Y5V, SMD 0805; Manufacturer: YAGEO; Manufacturer Part Number: CC0805ZRY5V7BB684; Temperature Rating: -20%~+80%; Package Size: 0805; JLCPCB Basic Part: No; JLCPCB Part Number: C2203054; Supplier 1: LCSC; Category: Capacitors - MLCC; Supplier Part Number 1: C2203054; Voltage Rating: 16V; Temperature Coefficient: Y5V; RoHS: Yes; ComponentLink1Description: Datasheet; ComponentLink1URL: https://wmsc.lcsc.com/wmsc/upload/file/pdf/v2/lcsc/2304140030_YAGEO-CC0805ZRY5V7BB684_C2203054.pdf; ComponentLink2Description: JLCPCB Part URL; ComponentLink2URL: https://jlcpcb.com/partdetail/C2203054; ComponentLink3Description: LCSC Part URL; ComponentLink3URL: https://lcsc.com/product-detail/Multilayer-Ceramic-Capacitors-MLCC---SMD-SMT_YAGEO-YAGEO-CC0805ZRY5V7BB684_C2203054.html
footprint CAP-0805 (0805 (2012M) Capacitor)
pins: 1, 2

## CC0805ZRY5V8BB104
designator C?  Capacitance: 100nF  (hidden comment: *)
Capacitor, Ceramic (MLCC), 100nF, 25V, Y5V, SMD 0805; Manufacturer: YAGEO; Manufacturer Part Number: CC0805ZRY5V8BB104; Temperature Rating: -20%~+80%; Package Size: 0805; JLCPCB Basic Part: No; JLCPCB Part Number: C519930; Supplier 1: LCSC; Category: Capacitors - MLCC; Supplier Part Number 1: C519930; Voltage Rating: 25V; Temperature Coefficient: Y5V; RoHS: Yes; ComponentLink1Description: Datasheet; ComponentLink1URL: https://wmsc.lcsc.com/wmsc/upload/file/pdf/v2/lcsc/2008171233_YAGEO-CC0805ZRY5V8BB104_C519930.pdf; ComponentLink2Description: JLCPCB Part URL; ComponentLink2URL: https://jlcpcb.com/partdetail/C519930; ComponentLink3Description: LCSC Part URL; ComponentLink3URL: https://lcsc.com/product-detail/Multilayer-Ceramic-Capacitors-MLCC---SMD-SMT_YAGEO-YAGEO-CC0805ZRY5V8BB104_C519930.html
footprint CAP-0805 (0805 (2012M) Capacitor)
pins: 1, 2

## CC0805ZRY5V8BB105
designator C?  Capacitance: 1uF  (hidden comment: *)
Capacitor, Ceramic (MLCC), 1uF, 25V, Y5V, SMD 0805; Manufacturer: YAGEO; Manufacturer Part Number: CC0805ZRY5V8BB105; Temperature Rating: -20%~+80%; Package Size: 0805; JLCPCB Basic Part: No; JLCPCB Part Number: C106837; Supplier 1: LCSC; Category: Capacitors - MLCC; Supplier Part Number 1: C106837; Voltage Rating: 25V; Temperature Coefficient: Y5V; RoHS: Yes; ComponentLink1Description: Datasheet; ComponentLink1URL: https://wmsc.lcsc.com/wmsc/upload/file/pdf/v2/lcsc/2304140030_YAGEO-CC0805ZRY5V8BB105_C106837.pdf; ComponentLink2Description: JLCPCB Part URL; ComponentLink2URL: https://jlcpcb.com/partdetail/C106837; ComponentLink3Description: LCSC Part URL; ComponentLink3URL: https://lcsc.com/product-detail/Multilayer-Ceramic-Capacitors-MLCC---SMD-SMT_YAGEO-YAGEO-CC0805ZRY5V8BB105_C106837.html
footprint CAP-0805 (0805 (2012M) Capacitor)
pins: 1, 2